# Altium footprint library HyTechManufacturing.PCBLIB: 24 footprints (part 2 of 2)
Each footprint in its own frame and in the unit in brackets; x right, y up, seen from the top. Pads: shape width x height; smd on the part's side, far side on the other; paste and mask are expansions set on the pad; w line width, h text height; cw(c..) or ccw(c..) is an arc to the next point about the centre after c.
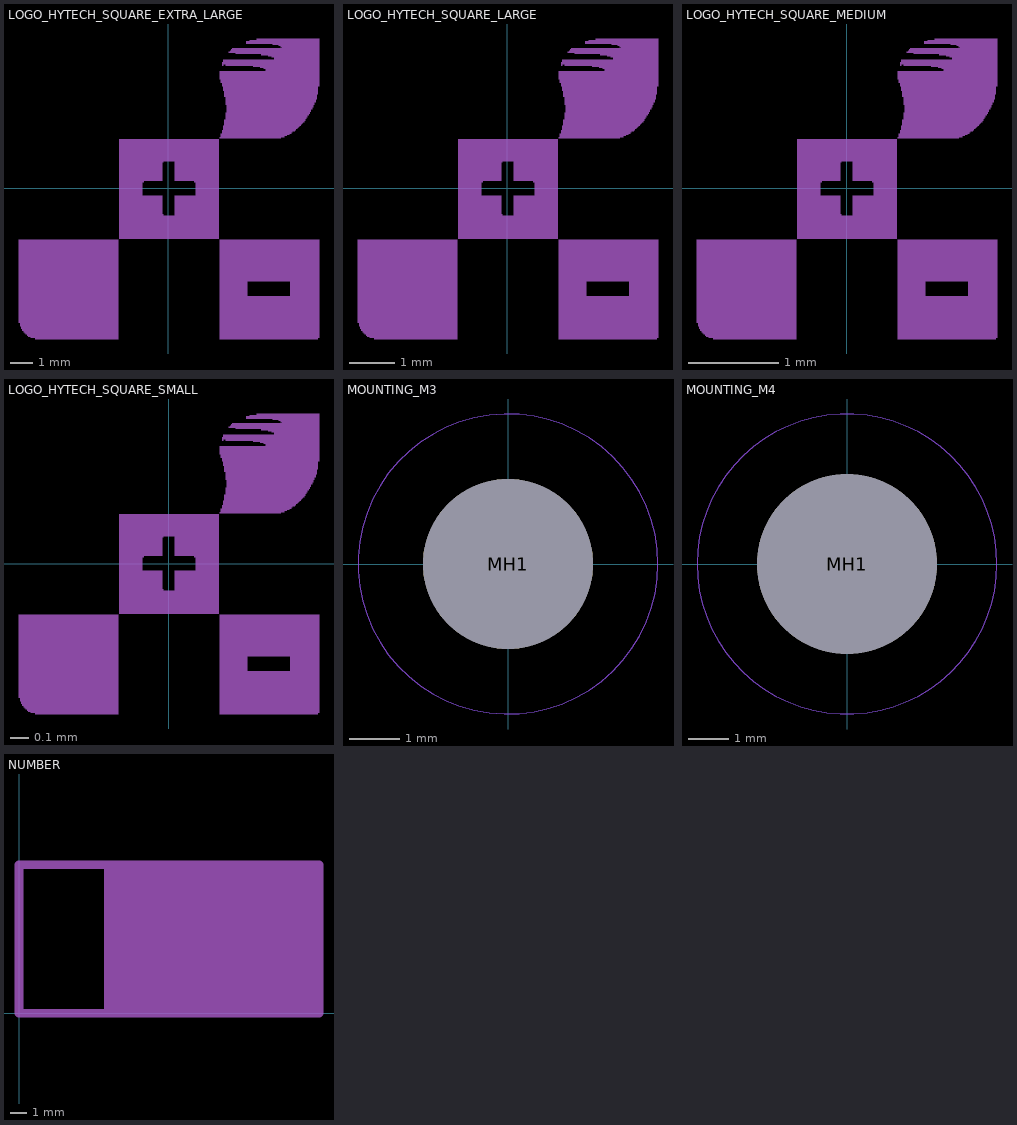
[diagram p1: the footprints below, top view; thin cyan lines are the x and y axes]

## LOGO_HYTECH_SQUARE_EXTRA_LARGE [mm]
tPlace:
  drawing of 405 lines, arcs and shapes, not listed

## LOGO_HYTECH_SQUARE_LARGE [mm]
tPlace:
  drawing of 405 lines, arcs and shapes, not listed

## LOGO_HYTECH_SQUARE_MEDIUM [mm]
tPlace:
  drawing of 405 lines, arcs and shapes, not listed

## LOGO_HYTECH_SQUARE_SMALL [mm]
tPlace:
  drawing of 405 lines, arcs and shapes, not listed

## MOUNTING_M3 [mm]
pads (1):
  round 3.4 hole 3.4 unplated: MH1(0,0)
Top keep-out:
  circle w0: c0,0 r3
  circle w0: c0,0 r3
  circle w0: c0,0 r3
Bottom keep-out:
  circle w0: c0,0 r3
  circle w0: c0,0 r3

## MOUNTING_M4 [mm]
pads (1):
  round 4.5 hole 4.5 unplated: MH1(0,0)
Top keep-out:
  circle w0: c0,0 r3.75
  circle w0: c0,0 r3.75
  circle w0: c0,0 r3.75
Bottom keep-out:
  circle w0: c0,0 r3.75
  circle w0: c0,0 r3.75

## NUMBER [mm]
tPlace:
  region: 5.08,0 5.08,8.89 17.907,8.89 17.907,0
  lines w0.508: 0,0 0,8.89 17.907,8.89 17.907,0 0,0
  text "#" at 2.667,4.445 h5.18

## TS [mm]
tPlace:
  text "TS" at 0,0 h1.73
bPlace:
  text "TS" at 0,0 h1.73